# Altium footprint library con-samtec.PCBLIB: 805 footprints (part 47 of 55) (continued)
## TSW-140-02-S-T [mm] (continued)
  rectangle: 3.46,2.19 4.16,2.89
  rectangle: 6,-2.89 6.7,-2.19
  rectangle: 6,-0.35 6.7,0.35
  rectangle: 6,2.19 6.7,2.89
  rectangle: 8.54,-2.89 9.24,-2.19
  rectangle: 8.54,-0.35 9.24,0.35
  rectangle: 8.54,2.19 9.24,2.89
  rectangle: 11.08,-2.89 11.78,-2.19
  rectangle: 11.08,-0.35 11.78,0.35
  rectangle: 11.08,2.19 11.78,2.89
  rectangle: 13.62,-2.89 14.32,-2.19
  rectangle: 13.62,-0.35 14.32,0.35
  rectangle: 13.62,2.19 14.32,2.89
  rectangle: 16.16,-2.89 16.86,-2.19
  rectangle: 16.16,-0.35 16.86,0.35
  rectangle: 16.16,2.19 16.86,2.89
  rectangle: 18.7,-2.89 19.4,-2.19
  rectangle: 18.7,-0.35 19.4,0.35
  rectangle: 18.7,2.19 19.4,2.89
  rectangle: 21.24,-2.89 21.94,-2.19
  rectangle: 21.24,-0.35 21.94,0.35
  rectangle: 21.24,2.19 21.94,2.89
  rectangle: 23.78,-2.89 24.48,-2.19
  rectangle: 23.78,-0.35 24.48,0.35
  rectangle: 23.78,2.19 24.48,2.89
  rectangle: 26.32,-2.89 27.02,-2.19
  rectangle: 26.32,-0.35 27.02,0.35
  rectangle: 26.32,2.19 27.02,2.89
  rectangle: 28.86,-2.89 29.56,-2.19
  rectangle: 28.86,-0.35 29.56,0.35
  rectangle: 28.86,2.19 29.56,2.89
  rectangle: 31.4,-2.89 32.1,-2.19
  rectangle: 31.4,-0.35 32.1,0.35
  rectangle: 31.4,2.19 32.1,2.89
  rectangle: 33.94,-2.89 34.64,-2.19
  rectangle: 33.94,-0.35 34.64,0.35
  rectangle: 33.94,2.19 34.64,2.89
  rectangle: 36.48,-2.89 37.18,-2.19
  rectangle: 36.48,-0.35 37.18,0.35
  rectangle: 36.48,2.19 37.18,2.89
  rectangle: 39.02,-2.89 39.72,-2.19
  rectangle: 39.02,-0.35 39.72,0.35
  rectangle: 39.02,2.19 39.72,2.89
  rectangle: 41.56,-2.89 42.26,-2.19
  rectangle: 41.56,-0.35 42.26,0.35
  rectangle: 41.56,2.19 42.26,2.89
  rectangle: 44.1,-2.89 44.8,-2.19
  rectangle: 44.1,-0.35 44.8,0.35
  rectangle: 44.1,2.19 44.8,2.89
  rectangle: 46.64,-2.89 47.34,-2.19
  rectangle: 46.64,-0.35 47.34,0.35
  rectangle: 46.64,2.19 47.34,2.89
  rectangle: 49.18,-2.89 49.88,-2.19
  rectangle: 49.18,-0.35 49.88,0.35
  rectangle: 49.18,2.19 49.88,2.89

## TSW-140-02-S-T-RA [mil]
pads (120):
  oct 59.06x59.06 hole 39.37: 1(1950,60) 2(1950,160) 3(1950,260) 4(1850,60) 5(1850,160) 6(1850,260) 7(1750,60) 8(1750,160) 9(1750,260) 10(1650,60) 11(1650,160) 12(1650,260) 13(1550,60) 14(1550,160) 15(1550,260) 16(1450,60) 17(1450,160) 18(1450,260) 19(1350,60) 20(1350,160) 21(1350,260) 22(1250,60) 23(1250,160) 24(1250,260) 25(1150,60) 26(1150,160) 27(1150,260) 28(1050,60) 29(1050,160) 30(1050,260) 31(950,60) 32(950,160) 33(950,260) 34(850,60) 35(850,160) 36(850,260) 37(750,60) 38(750,160) 39(750,260) 40(650,60) 41(650,160) 42(650,260) 43(550,60) 44(550,160) 45(550,260) 46(450,60) 47(450,160) 48(450,260) 49(350,60) 50(350,160) 51(350,260) 52(250,60) 53(250,160) 54(250,260) 55(150,60) 56(150,160) 57(150,260) 58(50,60) 59(50,160) 60(50,260) 61(-50,60) 62(-50,160) 63(-50,260) 64(-150,60) 65(-150,160) 66(-150,260) 67(-250,60) 68(-250,160) 69(-250,260) 70(-350,60) 71(-350,160) 72(-350,260) 73(-450,60) 74(-450,160) 75(-450,260) 76(-550,60) 77(-550,160) 78(-550,260) 79(-650,60) 80(-650,160) 81(-650,260) 82(-750,60) 83(-750,160) 84(-750,260) 85(-850,60) 86(-850,160) 87(-850,260) 88(-950,60) 89(-950,160) 90(-950,260) 91(-1050,60) 92(-1050,160) 93(-1050,260) 94(-1150,60) 95(-1150,160) 96(-1150,260) 97(-1250,60) 98(-1250,160) 99(-1250,260) 100(-1350,60) 101(-1350,160) 102(-1350,260) 103(-1450,60) 104(-1450,160) 105(-1450,260) 106(-1550,60) 107(-1550,160) 108(-1550,260) 109(-1650,60) 110(-1650,160) 111(-1650,260) 112(-1750,60) 113(-1750,160) 114(-1750,260) 115(-1850,60) 116(-1850,160) 117(-1850,260) 118(-1950,60) 119(-1950,160) 120(-1950,260)
Top Overlay:
  rectangle: -1960,-310.63 -1940,-80.32
  rectangle: -1860,-310.63 -1840,-80.32
  rectangle: -1760,-310.63 -1740,-80.32
  rectangle: -1660,-310.63 -1640,-80.32
  rectangle: -1560,-310.63 -1540,-80.32
  rectangle: -1460,-310.63 -1440,-80.32
  rectangle: -1360,-310.63 -1340,-80.32
  rectangle: -1260,-310.63 -1240,-80.32
  rectangle: -1160,-310.63 -1140,-80.32
  rectangle: -1060,-310.63 -1040,-80.32
  rectangle: -960,-310.63 -940,-80.32
  rectangle: -860,-310.63 -840,-80.32
  rectangle: -760,-310.63 -740,-80.32
  rectangle: -660,-310.63 -640,-80.32
  rectangle: -560,-310.63 -540,-80.32
  rectangle: -460,-310.63 -440,-80.32
  rectangle: -360,-310.63 -340,-80.32
  rectangle: -260,-310.63 -240,-80.32
  rectangle: -160,-310.63 -140,-80.32
  rectangle: -60,-310.63 -40,-80.32
  rectangle: 40,-310.63 60,-80.32
  rectangle: 140,-310.63 160,-80.32
  rectangle: 240,-310.63 260,-80.32
  rectangle: 340,-310.63 360,-80.32
  rectangle: 440,-310.63 460,-80.32
  rectangle: 540,-310.63 560,-80.32
  rectangle: 640,-310.63 660,-80.32
  rectangle: 740,-310.63 760,-80.32
  rectangle: 840,-310.63 860,-80.32
  rectangle: 940,-310.63 960,-80.32
  rectangle: 1040,-310.63 1060,-80.32
  rectangle: 1140,-310.63 1160,-80.32
  rectangle: 1240,-310.63 1260,-80.32
  rectangle: 1340,-310.63 1360,-80.32
  rectangle: 1440,-310.63 1460,-80.32
  rectangle: 1540,-310.63 1560,-80.32
  rectangle: 1640,-310.63 1660,-80.32
  rectangle: 1740,-310.63 1760,-80.32
  rectangle: 1840,-310.63 1860,-80.32
  rectangle: 1940,-310.63 1960,-80.32
  lines w8: -2005.08,-80.55 2005.08,-80.55 2005.08,-4.17 -2005.08,-4.17 -2005.08,-80.55
  text "1" at 2001.57,41.34 h36.81
  text "3" at 2002.17,236.81 h36.81
Mechanical 16:
  rectangle: -1960,0 -1940,270
  rectangle: -1860,0 -1840,270
  rectangle: -1760,0 -1740,270
  rectangle: -1660,0 -1640,270
  rectangle: -1560,0 -1540,270
  rectangle: -1460,0 -1440,270
  rectangle: -1360,0 -1340,270
  rectangle: -1260,0 -1240,270
  rectangle: -1160,0 -1140,270
  rectangle: -1060,0 -1040,270
  rectangle: -960,0 -940,270
  rectangle: -860,0 -840,270
  rectangle: -760,0 -740,270
  rectangle: -660,0 -640,270
  rectangle: -560,0 -540,270
  rectangle: -460,0 -440,270
  rectangle: -360,0 -340,270
  rectangle: -260,0 -240,270
  rectangle: -160,0 -140,270
  rectangle: -60,0 -40,270
  rectangle: 40,0 60,270
  rectangle: 140,0 160,270
  rectangle: 240,0 260,270
  rectangle: 340,0 360,270
  rectangle: 440,0 460,270
  rectangle: 540,0 560,270
  rectangle: 640,0 660,270
  rectangle: 740,0 760,270
  rectangle: 840,0 860,270
  rectangle: 940,0 960,270
  rectangle: 1040,0 1060,270
  rectangle: 1140,0 1160,270
  rectangle: 1240,0 1260,270
  rectangle: 1340,0 1360,270
  rectangle: 1440,0 1460,270
  rectangle: 1540,0 1560,270
  rectangle: 1640,0 1660,270
  rectangle: 1740,0 1760,270
  rectangle: 1840,0 1860,270
  rectangle: 1940,0 1960,270

## TSW-141-02-S-D [mm]
pads (82):
  oct 1.5x1.5 hole 1: 1(50.8,-1.27) 2(50.8,1.27) 3(48.26,-1.27) 4(48.26,1.27) 5(45.72,-1.27) 6(45.72,1.27) 7(43.18,-1.27) 8(43.18,1.27) 9(40.64,-1.27) 10(40.64,1.27) 11(38.1,-1.27) 12(38.1,1.27) 13(35.56,-1.27) 14(35.56,1.27) 15(33.02,-1.27) 16(33.02,1.27) 17(30.48,-1.27) 18(30.48,1.27) 19(27.94,-1.27) 20(27.94,1.27) 21(25.4,-1.27) 22(25.4,1.27) 23(22.86,-1.27) 24(22.86,1.27) 25(20.32,-1.27) 26(20.32,1.27) 27(17.78,-1.27) 28(17.78,1.27) 29(15.24,-1.27) 30(15.24,1.27) 31(12.7,-1.27) 32(12.7,1.27) 33(10.16,-1.27) 34(10.16,1.27) 35(7.62,-1.27) 36(7.62,1.27) 37(5.08,-1.27) 38(5.08,1.27) 39(2.54,-1.27) 40(2.54,1.27) 41(0,-1.27) 42(0,1.27) 43(-2.54,-1.27) 44(-2.54,1.27) 45(-5.08,-1.27) 46(-5.08,1.27) 47(-7.62,-1.27) 48(-7.62,1.27) 49(-10.16,-1.27) 50(-10.16,1.27) 51(-12.7,-1.27) 52(-12.7,1.27) 53(-15.24,-1.27) 54(-15.24,1.27) 55(-17.78,-1.27) 56(-17.78,1.27) 57(-20.32,-1.27) 58(-20.32,1.27) 59(-22.86,-1.27) 60(-22.86,1.27) 61(-25.4,-1.27) 62(-25.4,1.27) 63(-27.94,-1.27) 64(-27.94,1.27) 65(-30.48,-1.27) 66(-30.48,1.27) 67(-33.02,-1.27) 68(-33.02,1.27) 69(-35.56,-1.27) 70(-35.56,1.27) 71(-38.1,-1.27) 72(-38.1,1.27) 73(-40.64,-1.27) 74(-40.64,1.27) 75(-43.18,-1.27) 76(-43.18,1.27) 77(-45.72,-1.27) 78(-45.72,1.27) 79(-48.26,-1.27) 80(-48.26,1.27) 81(-50.8,-1.27) 82(-50.8,1.27)
Top Overlay:
  lines w0.203: -52.199,-2.425 52.199,-2.425 52.199,2.425 -52.199,2.425 -52.199,-2.425
  text "1" at 50.592,-3.818 h0.94
  text "2" at 50.417,2.744 h0.94
Mechanical 16:
  rectangle: -51.15,-1.62 -50.45,-0.92
  rectangle: -51.15,0.92 -50.45,1.62
  rectangle: -48.61,-1.62 -47.91,-0.92
  rectangle: -48.61,0.92 -47.91,1.62
  rectangle: -46.07,-1.62 -45.37,-0.92
  rectangle: -46.07,0.92 -45.37,1.62
  rectangle: -43.53,-1.62 -42.83,-0.92
  rectangle: -43.53,0.92 -42.83,1.62
  rectangle: -40.99,-1.62 -40.29,-0.92
  rectangle: -40.99,0.92 -40.29,1.62
  rectangle: -38.45,-1.62 -37.75,-0.92
  rectangle: -38.45,0.92 -37.75,1.62
  rectangle: -35.91,-1.62 -35.21,-0.92
  rectangle: -35.91,0.92 -35.21,1.62
  rectangle: -33.37,-1.62 -32.67,-0.92
  rectangle: -33.37,0.92 -32.67,1.62
  rectangle: -30.83,-1.62 -30.13,-0.92
  rectangle: -30.83,0.92 -30.13,1.62
  rectangle: -28.29,-1.62 -27.59,-0.92
  rectangle: -28.29,0.92 -27.59,1.62
  rectangle: -25.75,-1.62 -25.05,-0.92
  rectangle: -25.75,0.92 -25.05,1.62
  rectangle: -23.21,-1.62 -22.51,-0.92
  rectangle: -23.21,0.92 -22.51,1.62
  rectangle: -20.67,-1.62 -19.97,-0.92
  rectangle: -20.67,0.92 -19.97,1.62
  rectangle: -18.13,-1.62 -17.43,-0.92
  rectangle: -18.13,0.92 -17.43,1.62
  rectangle: -15.59,-1.62 -14.89,-0.92
  rectangle: -15.59,0.92 -14.89,1.62
  rectangle: -13.05,-1.62 -12.35,-0.92
  rectangle: -13.05,0.92 -12.35,1.62
  rectangle: -10.51,-1.62 -9.81,-0.92
  rectangle: -10.51,0.92 -9.81,1.62
  rectangle: -7.97,-1.62 -7.27,-0.92
  rectangle: -7.97,0.92 -7.27,1.62
  rectangle: -5.43,-1.62 -4.73,-0.92
  rectangle: -5.43,0.92 -4.73,1.62
  rectangle: -2.89,-1.62 -2.19,-0.92
  rectangle: -2.89,0.92 -2.19,1.62
  rectangle: -0.35,-1.62 0.35,-0.92
  rectangle: -0.35,0.92 0.35,1.62
  rectangle: 2.19,-1.62 2.89,-0.92
  rectangle: 2.19,0.92 2.89,1.62
  rectangle: 4.73,-1.62 5.43,-0.92
  rectangle: 4.73,0.92 5.43,1.62
  rectangle: 7.27,-1.62 7.97,-0.92
  rectangle: 7.27,0.92 7.97,1.62
  rectangle: 9.81,-1.62 10.51,-0.92
  rectangle: 9.81,0.92 10.51,1.62
  rectangle: 12.35,-1.62 13.05,-0.92
  rectangle: 12.35,0.92 13.05,1.62
  rectangle: 14.89,-1.62 15.59,-0.92
  rectangle: 14.89,0.92 15.59,1.62
  rectangle: 17.43,-1.62 18.13,-0.92
  rectangle: 17.43,0.92 18.13,1.62
  rectangle: 19.97,-1.62 20.67,-0.92
  rectangle: 19.97,0.92 20.67,1.62
  rectangle: 22.51,-1.62 23.21,-0.92
  rectangle: 22.51,0.92 23.21,1.62
  rectangle: 25.05,-1.62 25.75,-0.92
  rectangle: 25.05,0.92 25.75,1.62
  rectangle: 27.59,-1.62 28.29,-0.92
  rectangle: 27.59,0.92 28.29,1.62
  rectangle: 30.13,-1.62 30.83,-0.92
  rectangle: 30.13,0.92 30.83,1.62
  rectangle: 32.67,-1.62 33.37,-0.92
  rectangle: 32.67,0.92 33.37,1.62
  rectangle: 35.21,-1.62 35.91,-0.92
  rectangle: 35.21,0.92 35.91,1.62
  rectangle: 37.75,-1.62 38.45,-0.92
  rectangle: 37.75,0.92 38.45,1.62
  rectangle: 40.29,-1.62 40.99,-0.92
  rectangle: 40.29,0.92 40.99,1.62
  rectangle: 42.83,-1.62 43.53,-0.92
  rectangle: 42.83,0.92 43.53,1.62
  rectangle: 45.37,-1.62 46.07,-0.92
  rectangle: 45.37,0.92 46.07,1.62
  rectangle: 47.91,-1.62 48.61,-0.92
  rectangle: 47.91,0.92 48.61,1.62
  rectangle: 50.45,-1.62 51.15,-0.92
  rectangle: 50.45,0.92 51.15,1.62

## TSW-141-02-S-D-RA [mil]
pads (82):
  oct 59.06x59.06 hole 39.37: 1(2000,60) 2(2000,160) 3(1900,60) 4(1900,160) 5(1800,60) 6(1800,160) 7(1700,60) 8(1700,160) 9(1600,60) 10(1600,160) 11(1500,60) 12(1500,160) 13(1400,60) 14(1400,160) 15(1300,60) 16(1300,160) 17(1200,60) 18(1200,160) 19(1100,60) 20(1100,160) 21(1000,60) 22(1000,160) 23(900,60) 24(900,160) 25(800,60) 26(800,160) 27(700,60) 28(700,160) 29(600,60) 30(600,160) 31(500,60) 32(500,160) 33(400,60) 34(400,160) 35(300,60) 36(300,160) 37(200,60) 38(200,160) 39(100,60) 40(100,160) 41(0,60) 42(0,160) 43(-100,60) 44(-100,160) 45(-200,60) 46(-200,160) 47(-300,60) 48(-300,160) 49(-400,60) 50(-400,160) 51(-500,60) 52(-500,160) 53(-600,60) 54(-600,160) 55(-700,60) 56(-700,160) 57(-800,60) 58(-800,160) 59(-900,60) 60(-900,160) 61(-1000,60) 62(-1000,160) 63(-1100,60) 64(-1100,160) 65(-1200,60) 66(-1200,160) 67(-1300,60) 68(-1300,160) 69(-1400,60) 70(-1400,160) 71(-1500,60) 72(-1500,160) 73(-1600,60) 74(-1600,160) 75(-1700,60) 76(-1700,160) 77(-1800,60) 78(-1800,160) 79(-1900,60) 80(-1900,160) 81(-2000,60) 82(-2000,160)
Top Overlay:
  rectangle: -2010,-310.63 -1990,-80.32
  rectangle: -1910,-310.63 -1890,-80.32
  rectangle: -1810,-310.63 -1790,-80.32
  rectangle: -1710,-310.63 -1690,-80.32
  rectangle: -1610,-310.63 -1590,-80.32
  rectangle: -1510,-310.63 -1490,-80.32
  rectangle: -1410,-310.63 -1390,-80.32
  rectangle: -1310,-310.63 -1290,-80.32
  rectangle: -1210,-310.63 -1190,-80.32
  rectangle: -1110,-310.63 -1090,-80.32
  rectangle: -1010,-310.63 -990,-80.32
  rectangle: -910,-310.63 -890,-80.32
  rectangle: -810,-310.63 -790,-80.32
  rectangle: -710,-310.63 -690,-80.32
  rectangle: -610,-310.63 -590,-80.32
  rectangle: -510,-310.63 -490,-80.32
  rectangle: -410,-310.63 -390,-80.32
  rectangle: -310,-310.63 -290,-80.32
  rectangle: -210,-310.63 -190,-80.32
  rectangle: -110,-310.63 -90,-80.32
  rectangle: -10,-310.63 10,-80.32
  rectangle: 90,-310.63 110,-80.32
  rectangle: 190,-310.63 210,-80.32
  rectangle: 290,-310.63 310,-80.32
  rectangle: 390,-310.63 410,-80.32
  rectangle: 490,-310.63 510,-80.32
  rectangle: 590,-310.63 610,-80.32
  rectangle: 690,-310.63 710,-80.32
  rectangle: 790,-310.63 810,-80.32
  rectangle: 890,-310.63 910,-80.32
  rectangle: 990,-310.63 1010,-80.32
  rectangle: 1090,-310.63 1110,-80.32
  rectangle: 1190,-310.63 1210,-80.32
  rectangle: 1290,-310.63 1310,-80.32
  rectangle: 1390,-310.63 1410,-80.32
  rectangle: 1490,-310.63 1510,-80.32
  rectangle: 1590,-310.63 1610,-80.32
  rectangle: 1690,-310.63 1710,-80.32
  rectangle: 1790,-310.63 1810,-80.32
  rectangle: 1890,-310.63 1910,-80.32
  rectangle: 1990,-310.63 2010,-80.32
  lines w8: -2055.08,-80.55 2055.08,-80.55 2055.08,-4.17 -2055.08,-4.17 -2055.08,-80.55
  text "1" at 2050.59,30.51 h36.81
  text "2" at 2049.21,129.53 h36.81
Mechanical 16:
  rectangle: -2010,0 -1990,170
  rectangle: -1910,0 -1890,170
  rectangle: -1810,0 -1790,170
  rectangle: -1710,0 -1690,170
  rectangle: -1610,0 -1590,170
  rectangle: -1510,0 -1490,170
  rectangle: -1410,0 -1390,170
  rectangle: -1310,0 -1290,170
  rectangle: -1210,0 -1190,170
  rectangle: -1110,0 -1090,170
  rectangle: -1010,0 -990,170
  rectangle: -910,0 -890,170
  rectangle: -810,0 -790,170
  rectangle: -710,0 -690,170
  rectangle: -610,0 -590,170
  rectangle: -510,0 -490,170
  rectangle: -410,0 -390,170
  rectangle: -310,0 -290,170
  rectangle: -210,0 -190,170
  rectangle: -110,0 -90,170
  rectangle: -10,0 10,170
  rectangle: 90,0 110,170
  rectangle: 190,0 210,170
  rectangle: 290,0 310,170
  rectangle: 390,0 410,170
  rectangle: 490,0 510,170
  rectangle: 590,0 610,170
  rectangle: 690,0 710,170
  rectangle: 790,0 810,170
  rectangle: 890,0 910,170
  rectangle: 990,0 1010,170
  rectangle: 1090,0 1110,170
  rectangle: 1190,0 1210,170
  rectangle: 1290,0 1310,170
  rectangle: 1390,0 1410,170
  rectangle: 1490,0 1510,170
  rectangle: 1590,0 1610,170
  rectangle: 1690,0 1710,170
  rectangle: 1790,0 1810,170
  rectangle: 1890,0 1910,170
  rectangle: 1990,0 2010,170

## TSW-141-02-S-Q [mm]
pads (82):
  oct 1.5x1.5 hole 1: 1(50.8,-2.54) 2(50.8,2.54) 3(48.26,-2.54) 4(48.26,2.54) 5(45.72,-2.54) 6(45.72,2.54) 7(43.18,-2.54) 8(43.18,2.54) 9(40.64,-2.54) 10(40.64,2.54) 11(38.1,-2.54) 12(38.1,2.54) 13(35.56,-2.54) 14(35.56,2.54) 15(33.02,-2.54) 16(33.02,2.54) 17(30.48,-2.54) 18(30.48,2.54) 19(27.94,-2.54) 20(27.94,2.54) 21(25.4,-2.54) 22(25.4,2.54) 23(22.86,-2.54) 24(22.86,2.54) 25(20.32,-2.54) 26(20.32,2.54) 27(17.78,-2.54) 28(17.78,2.54) 29(15.24,-2.54) 30(15.24,2.54) 31(12.7,-2.54) 32(12.7,2.54) 33(10.16,-2.54) 34(10.16,2.54) 35(7.62,-2.54) 36(7.62,2.54) 37(5.08,-2.54) 38(5.08,2.54) 39(2.54,-2.54) 40(2.54,2.54) 41(0,-2.54) 42(0,2.54) 43(-2.54,-2.54) 44(-2.54,2.54) 45(-5.08,-2.54) 46(-5.08,2.54) 47(-7.62,-2.54) 48(-7.62,2.54) 49(-10.16,-2.54) 50(-10.16,2.54) 51(-12.7,-2.54) 52(-12.7,2.54) 53(-15.24,-2.54) 54(-15.24,2.54) 55(-17.78,-2.54) 56(-17.78,2.54) 57(-20.32,-2.54) 58(-20.32,2.54) 59(-22.86,-2.54) 60(-22.86,2.54) 61(-25.4,-2.54) 62(-25.4,2.54) 63(-27.94,-2.54) 64(-27.94,2.54) 65(-30.48,-2.54) 66(-30.48,2.54) 67(-33.02,-2.54) 68(-33.02,2.54) 69(-35.56,-2.54) 70(-35.56,2.54) 71(-38.1,-2.54) 72(-38.1,2.54) 73(-40.64,-2.54) 74(-40.64,2.54) 75(-43.18,-2.54) 76(-43.18,2.54) 77(-45.72,-2.54) 78(-45.72,2.54) 79(-48.26,-2.54) 80(-48.26,2.54) 81(-50.8,-2.54) 82(-50.8,2.54)
Top Overlay:
  lines w0.203: -52.199,-3.695 52.199,-3.695 52.199,3.695 -52.199,3.695 -52.199,-3.695
  text "1" at 50.642,-5.138 h0.94
  text "2" at 50.542,3.989 h0.94
Mechanical 16:
  rectangle: -51.15,-2.89 -50.45,-2.19
  rectangle: -51.15,2.19 -50.45,2.89
  rectangle: -48.61,-2.89 -47.91,-2.19
  rectangle: -48.61,2.19 -47.91,2.89
  rectangle: -46.07,-2.89 -45.37,-2.19
  rectangle: -46.07,2.19 -45.37,2.89
  rectangle: -43.53,-2.89 -42.83,-2.19
  rectangle: -43.53,2.19 -42.83,2.89
  rectangle: -40.99,-2.89 -40.29,-2.19
  rectangle: -40.99,2.19 -40.29,2.89
  rectangle: -38.45,-2.89 -37.75,-2.19
  rectangle: -38.45,2.19 -37.75,2.89
  rectangle: -35.91,-2.89 -35.21,-2.19
  rectangle: -35.91,2.19 -35.21,2.89
  rectangle: -33.37,-2.89 -32.67,-2.19
  rectangle: -33.37,2.19 -32.67,2.89
  rectangle: -30.83,-2.89 -30.13,-2.19
  rectangle: -30.83,2.19 -30.13,2.89
  rectangle: -28.29,-2.89 -27.59,-2.19
  rectangle: -28.29,2.19 -27.59,2.89
  rectangle: -25.75,-2.89 -25.05,-2.19
  rectangle: -25.75,2.19 -25.05,2.89
  rectangle: -23.21,-2.89 -22.51,-2.19
  rectangle: -23.21,2.19 -22.51,2.89
  rectangle: -20.67,-2.89 -19.97,-2.19
  rectangle: -20.67,2.19 -19.97,2.89
  rectangle: -18.13,-2.89 -17.43,-2.19
  rectangle: -18.13,2.19 -17.43,2.89
  rectangle: -15.59,-2.89 -14.89,-2.19
  rectangle: -15.59,2.19 -14.89,2.89
  rectangle: -13.05,-2.89 -12.35,-2.19
  rectangle: -13.05,2.19 -12.35,2.89
  rectangle: -10.51,-2.89 -9.81,-2.19
  rectangle: -10.51,2.19 -9.81,2.89
  rectangle: -7.97,-2.89 -7.27,-2.19
  rectangle: -7.97,2.19 -7.27,2.89
  rectangle: -5.43,-2.89 -4.73,-2.19
  rectangle: -5.43,2.19 -4.73,2.89
  rectangle: -2.89,-2.89 -2.19,-2.19
  rectangle: -2.89,2.19 -2.19,2.89
  rectangle: -0.35,-2.89 0.35,-2.19
  rectangle: -0.35,2.19 0.35,2.89
  rectangle: 2.19,-2.89 2.89,-2.19
  rectangle: 2.19,2.19 2.89,2.89
  rectangle: 4.73,-2.89 5.43,-2.19
  rectangle: 4.73,2.19 5.43,2.89
  rectangle: 7.27,-2.89 7.97,-2.19
  rectangle: 7.27,2.19 7.97,2.89
  rectangle: 9.81,-2.89 10.51,-2.19
  rectangle: 9.81,2.19 10.51,2.89
  rectangle: 12.35,-2.89 13.05,-2.19
  rectangle: 12.35,2.19 13.05,2.89
  rectangle: 14.89,-2.89 15.59,-2.19
  rectangle: 14.89,2.19 15.59,2.89
  rectangle: 17.43,-2.89 18.13,-2.19
  rectangle: 17.43,2.19 18.13,2.89
  rectangle: 19.97,-2.89 20.67,-2.19
  rectangle: 19.97,2.19 20.67,2.89
  rectangle: 22.51,-2.89 23.21,-2.19
  rectangle: 22.51,2.19 23.21,2.89
  rectangle: 25.05,-2.89 25.75,-2.19
  rectangle: 25.05,2.19 25.75,2.89
  rectangle: 27.59,-2.89 28.29,-2.19
  rectangle: 27.59,2.19 28.29,2.89
  rectangle: 30.13,-2.89 30.83,-2.19
  rectangle: 30.13,2.19 30.83,2.89
  rectangle: 32.67,-2.89 33.37,-2.19
  rectangle: 32.67,2.19 33.37,2.89
  rectangle: 35.21,-2.89 35.91,-2.19
  rectangle: 35.21,2.19 35.91,2.89
  rectangle: 37.75,-2.89 38.45,-2.19
  rectangle: 37.75,2.19 38.45,2.89
  rectangle: 40.29,-2.89 40.99,-2.19
  rectangle: 40.29,2.19 40.99,2.89
  rectangle: 42.83,-2.89 43.53,-2.19
  rectangle: 42.83,2.19 43.53,2.89
  rectangle: 45.37,-2.89 46.07,-2.19
  rectangle: 45.37,2.19 46.07,2.89
  rectangle: 47.91,-2.89 48.61,-2.19
  rectangle: 47.91,2.19 48.61,2.89
  rectangle: 50.45,-2.89 51.15,-2.19
  rectangle: 50.45,2.19 51.15,2.89

## TSW-141-02-S-Q-RA [mil]
pads (82):
  oct 59.06x59.06 hole 39.37: 1(2000,60) 2(2000,260) 3(1900,60) 4(1900,260) 5(1800,60) 6(1800,260) 7(1700,60) 8(1700,260) 9(1600,60) 10(1600,260) 11(1500,60) 12(1500,260) 13(1400,60) 14(1400,260) 15(1300,60) 16(1300,260) 17(1200,60) 18(1200,260) 19(1100,60) 20(1100,260) 21(1000,60) 22(1000,260) 23(900,60) 24(900,260) 25(800,60) 26(800,260) 27(700,60) 28(700,260) 29(600,60) 30(600,260) 31(500,60) 32(500,260) 33(400,60) 34(400,260) 35(300,60) 36(300,260) 37(200,60) 38(200,260) 39(100,60) 40(100,260) 41(0,60) 42(0,260) 43(-100,60) 44(-100,260) 45(-200,60) 46(-200,260) 47(-300,60) 48(-300,260) 49(-400,60) 50(-400,260) 51(-500,60) 52(-500,260) 53(-600,60) 54(-600,260) 55(-700,60) 56(-700,260) 57(-800,60) 58(-800,260) 59(-900,60) 60(-900,260) 61(-1000,60) 62(-1000,260) 63(-1100,60) 64(-1100,260) 65(-1200,60) 66(-1200,260) 67(-1300,60) 68(-1300,260) 69(-1400,60) 70(-1400,260) 71(-1500,60) 72(-1500,260) 73(-1600,60) 74(-1600,260) 75(-1700,60) 76(-1700,260) 77(-1800,60) 78(-1800,260) 79(-1900,60) 80(-1900,260) 81(-2000,60) 82(-2000,260)
Top Overlay:
  rectangle: -2010,-310.63 -1990,-80.32
  rectangle: -1910,-310.63 -1890,-80.32
  rectangle: -1810,-310.63 -1790,-80.32
  rectangle: -1710,-310.63 -1690,-80.32
  rectangle: -1610,-310.63 -1590,-80.32
  rectangle: -1510,-310.63 -1490,-80.32
  rectangle: -1410,-310.63 -1390,-80.32
  rectangle: -1310,-310.63 -1290,-80.32
  rectangle: -1210,-310.63 -1190,-80.32
  rectangle: -1110,-310.63 -1090,-80.32
  rectangle: -1010,-310.63 -990,-80.32
  rectangle: -910,-310.63 -890,-80.32
  rectangle: -810,-310.63 -790,-80.32
  rectangle: -710,-310.63 -690,-80.32
  rectangle: -610,-310.63 -590,-80.32
  rectangle: -510,-310.63 -490,-80.32
  rectangle: -410,-310.63 -390,-80.32
  rectangle: -310,-310.63 -290,-80.32
  rectangle: -210,-310.63 -190,-80.32
  rectangle: -110,-310.63 -90,-80.32
  rectangle: -10,-310.63 10,-80.32
  rectangle: 90,-310.63 110,-80.32
  rectangle: 190,-310.63 210,-80.32
  rectangle: 290,-310.63 310,-80.32
  rectangle: 390,-310.63 410,-80.32
  rectangle: 490,-310.63 510,-80.32
  rectangle: 590,-310.63 610,-80.32
  rectangle: 690,-310.63 710,-80.32
  rectangle: 790,-310.63 810,-80.32
  rectangle: 890,-310.63 910,-80.32
  rectangle: 990,-310.63 1010,-80.32
  rectangle: 1090,-310.63 1110,-80.32
  rectangle: 1190,-310.63 1210,-80.32
  rectangle: 1290,-310.63 1310,-80.32
  rectangle: 1390,-310.63 1410,-80.32
  rectangle: 1490,-310.63 1510,-80.32
  rectangle: 1590,-310.63 1610,-80.32
  rectangle: 1690,-310.63 1710,-80.32
  rectangle: 1790,-310.63 1810,-80.32
  rectangle: 1890,-310.63 1910,-80.32
  rectangle: 1990,-310.63 2010,-80.32
  lines w8: -2055.08,-80.55 2055.08,-80.55 2055.08,-4.17 -2055.08,-4.17 -2055.08,-80.55
  text "1" at 2053.54,43.31 h36.81
  text "2" at 2051.18,242.72 h36.81
Mechanical 16:
  rectangle: -2010,0 -1990,270
  rectangle: -1910,0 -1890,270
  rectangle: -1810,0 -1790,270
  rectangle: -1710,0 -1690,270
  rectangle: -1610,0 -1590,270
  rectangle: -1510,0 -1490,270
  rectangle: -1410,0 -1390,270
  rectangle: -1310,0 -1290,270
  rectangle: -1210,0 -1190,270
  rectangle: -1110,0 -1090,270
  rectangle: -1010,0 -990,270
  rectangle: -910,0 -890,270
  rectangle: -810,0 -790,270
  rectangle: -710,0 -690,270
  rectangle: -610,0 -590,270
  rectangle: -510,0 -490,270
  rectangle: -410,0 -390,270
  rectangle: -310,0 -290,270
  rectangle: -210,0 -190,270
  rectangle: -110,0 -90,270
  rectangle: -10,0 10,270
  rectangle: 90,0 110,270
  rectangle: 190,0 210,270
  rectangle: 290,0 310,270
  rectangle: 390,0 410,270
  rectangle: 490,0 510,270
  rectangle: 590,0 610,270
  rectangle: 690,0 710,270
  rectangle: 790,0 810,270
  rectangle: 890,0 910,270
  rectangle: 990,0 1010,270
  rectangle: 1090,0 1110,270
  rectangle: 1190,0 1210,270
  rectangle: 1290,0 1310,270
  rectangle: 1390,0 1410,270
  rectangle: 1490,0 1510,270
  rectangle: 1590,0 1610,270
  rectangle: 1690,0 1710,270
  rectangle: 1790,0 1810,270
  rectangle: 1890,0 1910,270
  rectangle: 1990,0 2010,270

## TSW-141-02-S-S [mm]
pads (41):
  oct 1.5x1.5 hole 1: 1(50.8,0) 2(48.26,0) 3(45.72,0) 4(43.18,0) 5(40.64,0) 6(38.1,0) 7(35.56,0) 8(33.02,0) 9(30.48,0) 10(27.94,0) 11(25.4,0) 12(22.86,0) 13(20.32,0) 14(17.78,0) 15(15.24,0) 16(12.7,0) 17(10.16,0) 18(7.62,0) 19(5.08,0) 20(2.54,0) 21(0,0) 22(-2.54,0) 23(-5.08,0) 24(-7.62,0) 25(-10.16,0) 26(-12.7,0) 27(-15.24,0) 28(-17.78,0) 29(-20.32,0) 30(-22.86,0) 31(-25.4,0) 32(-27.94,0) 33(-30.48,0) 34(-33.02,0) 35(-35.56,0) 36(-38.1,0) 37(-40.64,0) 38(-43.18,0) 39(-45.72,0) 40(-48.26,0) 41(-50.8,0)
Top Overlay:
  lines w0.203: -52.199,-1.155 52.199,-1.155 52.199,1.155 -52.199,1.155 -52.199,-1.155
  text "1" at 50.542,-2.498 h0.94
Mechanical 16:
  rectangle: -51.15,-0.35 -50.45,0.35
  rectangle: -48.61,-0.35 -47.91,0.35
  rectangle: -46.07,-0.35 -45.37,0.35
  rectangle: -43.53,-0.35 -42.83,0.35
  rectangle: -40.99,-0.35 -40.29,0.35
  rectangle: -38.45,-0.35 -37.75,0.35
  rectangle: -35.91,-0.35 -35.21,0.35
  rectangle: -33.37,-0.35 -32.67,0.35
  rectangle: -30.83,-0.35 -30.13,0.35
  rectangle: -28.29,-0.35 -27.59,0.35
  rectangle: -25.75,-0.35 -25.05,0.35
  rectangle: -23.21,-0.35 -22.51,0.35
  rectangle: -20.67,-0.35 -19.97,0.35
  rectangle: -18.13,-0.35 -17.43,0.35
  rectangle: -15.59,-0.35 -14.89,0.35
  rectangle: -13.05,-0.35 -12.35,0.35
  rectangle: -10.51,-0.35 -9.81,0.35
  rectangle: -7.97,-0.35 -7.27,0.35
  rectangle: -5.43,-0.35 -4.73,0.35
  rectangle: -2.89,-0.35 -2.19,0.35
  rectangle: -0.35,-0.35 0.35,0.35
  rectangle: 2.19,-0.35 2.89,0.35
  rectangle: 4.73,-0.35 5.43,0.35
  rectangle: 7.27,-0.35 7.97,0.35
  rectangle: 9.81,-0.35 10.51,0.35
  rectangle: 12.35,-0.35 13.05,0.35
  rectangle: 14.89,-0.35 15.59,0.35
  rectangle: 17.43,-0.35 18.13,0.35
  rectangle: 19.97,-0.35 20.67,0.35
  rectangle: 22.51,-0.35 23.21,0.35
  rectangle: 25.05,-0.35 25.75,0.35
  rectangle: 27.59,-0.35 28.29,0.35
  rectangle: 30.13,-0.35 30.83,0.35
  rectangle: 32.67,-0.35 33.37,0.35
  rectangle: 35.21,-0.35 35.91,0.35
  rectangle: 37.75,-0.35 38.45,0.35
  rectangle: 40.29,-0.35 40.99,0.35
  rectangle: 42.83,-0.35 43.53,0.35
  rectangle: 45.37,-0.35 46.07,0.35
  rectangle: 47.91,-0.35 48.61,0.35
  rectangle: 50.45,-0.35 51.15,0.35